# Altium footprint library 13-IC Packages-1bga1.PcbLib: 72 footprints (part 3 of 6) (continued)
## BGA165C100P11X15_1300X1500X140 [mm] "BGA, 1.00mm pitch,rect.;165 pin, 11 columns X 15 rows, 13.00mm X 15.00mm X 1.40mm H"
height 1.4
pads (165):
  round 0.45 smd: A1(-5,7) A2(-4,7) A3(-3,7) A4(-2,7) A5(-1,7) A6(0,7) A7(1,7) A8(2,7) A9(3,7) A10(4,7) A11(5,7) B1(-5,6) B2(-4,6) B3(-3,6) B4(-2,6) B5(-1,6) B6(0,6) B7(1,6) B8(2,6) B9(3,6) B10(4,6) B11(5,6) C1(-5,5) C2(-4,5) C3(-3,5) C4(-2,5) C5(-1,5) C6(0,5) C7(1,5) C8(2,5) C9(3,5) C10(4,5) C11(5,5) D1(-5,4) D2(-4,4) D3(-3,4) D4(-2,4) D5(-1,4) D6(0,4) D7(1,4) D8(2,4) D9(3,4) D10(4,4) D11(5,4) E1(-5,3) E2(-4,3) E3(-3,3) E4(-2,3) E5(-1,3) E6(0,3) E7(1,3) E8(2,3) E9(3,3) E10(4,3) E11(5,3) F1(-5,2) F2(-4,2) F3(-3,2) F4(-2,2) F5(-1,2) F6(0,2) F7(1,2) F8(2,2) F9(3,2) F10(4,2) F11(5,2) G1(-5,1) G2(-4,1) G3(-3,1) G4(-2,1) G5(-1,1) G6(0,1) G7(1,1) G8(2,1) G9(3,1) G10(4,1) G11(5,1) H1(-5,0) H2(-4,0) H3(-3,0) H4(-2,0) H5(-1,0) H6(0,0) H7(1,0) H8(2,0) H9(3,0) H10(4,0) H11(5,0) J1(-5,-1) J2(-4,-1) J3(-3,-1) J4(-2,-1) J5(-1,-1) J6(0,-1) J7(1,-1) J8(2,-1) J9(3,-1) J10(4,-1) J11(5,-1) K1(-5,-2) K2(-4,-2) K3(-3,-2) K4(-2,-2) K5(-1,-2) K6(0,-2) K7(1,-2) K8(2,-2) K9(3,-2) K10(4,-2) K11(5,-2) L1(-5,-3) L2(-4,-3) L3(-3,-3) L4(-2,-3) L5(-1,-3) L6(0,-3) L7(1,-3) L8(2,-3) L9(3,-3) L10(4,-3) L11(5,-3) M1(-5,-4) M2(-4,-4) M3(-3,-4) M4(-2,-4) M5(-1,-4) M6(0,-4) M7(1,-4) M8(2,-4) M9(3,-4) M10(4,-4) M11(5,-4) N1(-5,-5) N2(-4,-5) N3(-3,-5) N4(-2,-5) N5(-1,-5) N6(0,-5) N7(1,-5) N8(2,-5) N9(3,-5) N10(4,-5) N11(5,-5) P1(-5,-6) P2(-4,-6) P3(-3,-6) P4(-2,-6) P5(-1,-6) P6(0,-6) P7(1,-6) P8(2,-6) P9(3,-6) P10(4,-6) P11(5,-6) R1(-5,-7) R2(-4,-7) R3(-3,-7) R4(-2,-7) R5(-1,-7) R6(0,-7) R7(1,-7) R8(2,-7) R9(3,-7) R10(4,-7) R11(5,-7)
Top Overlay:
  circle w0.25: c-7.1,7.75 r0.125
  lines w0.2: -6.5,6.6 -5.5,7.6 ; -6.5,6.8 -5.7,7.6 ; -6.5,7 -5.9,7.6 ; -6.5,7.2 -6.1,7.6 ; -6.5,7.4 -6.3,7.6 ; -6.5,-7.6 -6.5,7.6 6.5,7.6 6.5,-7.6 -6.5,-7.6
Mechanical 14:
  lines w0.1: -6.5,6.5 -5.5,7.5 ; -6.5,6.6 -5.6,7.5 ; -6.5,6.7 -5.7,7.5 ; -6.5,6.8 -5.8,7.5 ; -6.5,6.9 -5.9,7.5 ; -6.5,7 -6,7.5 ; -6.5,7.1 -6.1,7.5 ; -6.5,7.2 -6.2,7.5 ; -6.5,7.3 -6.3,7.5 ; -6.5,7.4 -6.4,7.5 ; -6.5,-7.5 -6.5,7.5 6.5,7.5 6.5,-7.5 -6.5,-7.5
  text "A" at -7.3,6.7 h0.6
  text "B" at -7.3,5.7 h0.6
  text "C" at -7.3,4.7 h0.6
  text "D" at -7.3,3.7 h0.6
  text "E" at -7.3,2.7 h0.6
  text "F" at -7.3,1.7 h0.6
  text "G" at -7.3,0.7 h0.6
  text "H" at -7.3,-0.3 h0.6
  text "J" at -7.3,-1.3 h0.6
  text "K" at -7.3,-2.3 h0.6
  text "L" at -7.3,-3.3 h0.6
  text "M" at -7.3,-4.3 h0.6
  text "N" at -7.3,-5.3 h0.6
  text "P" at -7.3,-6.3 h0.6
  text "R" at -7.3,-7.3 h0.6
  text "1" at -4.675,7.9 h0.6
  text "6" at 0.275,7.9 h0.6
  text "7" at 1.275,7.9 h0.6
  text "8" at 2.25,7.9 h0.6
  text "9" at 3.325,7.9 h0.6
  text "10" at 4.125,7.9 h0.6
  text "11" at 5.175,7.9 h0.6
  text "5" at -0.725,7.9 h0.6
  text "4" at -1.725,7.9 h0.6
  text "3" at -2.725,7.9 h0.6
  text "2" at -3.725,7.9 h0.6
Mechanical 15:
  circle w0.05: c0,0 r0.35
  lines w0.05: -0.5,0 0.5,0 ; 0,-0.5 0,0.5 ; -7.5,-8.5 -7.5,8.5 7.5,8.5 7.5,-8.5 -7.5,-8.5
3D body "BGA165C100P11X15_1300X1500X140.stp": height 1.4, standoff 0, extent -6.5,-7.5 6.5,7.5

## BGA165C100P11X15_1500X1700X140 [mm] "BGA 1mm, Pitch, Rectangular 165 Pin, 11 Columns x 15 Rows, Body 15mm X 17mm X 1.4mm H"
height 1.55
pads (165):
  round 0.45 smd: A1(-5,7) A2(-4,7) A3(-3,7) A4(-2,7) A5(-1,7) A6(0,7) A7(1,7) A8(2,7) A9(3,7) A10(4,7) A11(5,7) B1(-5,6) B2(-4,6) B3(-3,6) B4(-2,6) B5(-1,6) B6(0,6) B7(1,6) B8(2,6) B9(3,6) B10(4,6) B11(5,6) C1(-5,5) C2(-4,5) C3(-3,5) C4(-2,5) C5(-1,5) C6(0,5) C7(1,5) C8(2,5) C9(3,5) C10(4,5) C11(5,5) D1(-5,4) D2(-4,4) D3(-3,4) D4(-2,4) D5(-1,4) D6(0,4) D7(1,4) D8(2,4) D9(3,4) D10(4,4) D11(5,4) E1(-5,3) E2(-4,3) E3(-3,3) E4(-2,3) E5(-1,3) E6(0,3) E7(1,3) E8(2,3) E9(3,3) E10(4,3) E11(5,3) F1(-5,2) F2(-4,2) F3(-3,2) F4(-2,2) F5(-1,2) F6(0,2) F7(1,2) F8(2,2) F9(3,2) F10(4,2) F11(5,2) G1(-5,1) G2(-4,1) G3(-3,1) G4(-2,1) G5(-1,1) G6(0,1) G7(1,1) G8(2,1) G9(3,1) G10(4,1) G11(5,1) H1(-5,0) H2(-4,0) H3(-3,0) H4(-2,0) H5(-1,0) H6(0,0) H7(1,0) H8(2,0) H9(3,0) H10(4,0) H11(5,0) J1(-5,-1) J2(-4,-1) J3(-3,-1) J4(-2,-1) J5(-1,-1) J6(0,-1) J7(1,-1) J8(2,-1) J9(3,-1) J10(4,-1) J11(5,-1) K1(-5,-2) K2(-4,-2) K3(-3,-2) K4(-2,-2) K5(-1,-2) K6(0,-2) K7(1,-2) K8(2,-2) K9(3,-2) K10(4,-2) K11(5,-2) L1(-5,-3) L2(-4,-3) L3(-3,-3) L4(-2,-3) L5(-1,-3) L6(0,-3) L7(1,-3) L8(2,-3) L9(3,-3) L10(4,-3) L11(5,-3) M1(-5,-4) M2(-4,-4) M3(-3,-4) M4(-2,-4) M5(-1,-4) M6(0,-4) M7(1,-4) M8(2,-4) M9(3,-4) M10(4,-4) M11(5,-4) N1(-5,-5) N2(-4,-5) N3(-3,-5) N4(-2,-5) N5(-1,-5) N6(0,-5) N7(1,-5) N8(2,-5) N9(3,-5) N10(4,-5) N11(5,-5) P1(-5,-6) P2(-4,-6) P3(-3,-6) P4(-2,-6) P5(-1,-6) P6(0,-6) P7(1,-6) P8(2,-6) P9(3,-6) P10(4,-6) P11(5,-6) R1(-5,-7) R2(-4,-7) R3(-3,-7) R4(-2,-7) R5(-1,-7) R6(0,-7) R7(1,-7) R8(2,-7) R9(3,-7) R10(4,-7) R11(5,-7)
Top Overlay:
  circle w0.25: c-8.125,7.9 r0.125
  lines w0.2: -7.5,7.5 -6.5,8.5 ; -7.5,7.7 -6.7,8.5 ; -7.5,7.9 -6.9,8.5 ; -7.5,8.1 -7.1,8.5 ; -7.5,8.3 -7.3,8.5 ; -7.5,-8.5 7.5,-8.5 7.5,8.5 -7.5,8.5 -7.5,-8.5
Mechanical 14:
  lines w0.1: -7.5,7.6 -6.6,8.5 ; -7.5,7.7 -6.7,8.5 ; -7.5,7.8 -6.8,8.5 ; -7.5,7.9 -6.9,8.5 ; -7.5,8 -7,8.5 ; -7.5,8.1 -7.1,8.5 ; -7.5,8.2 -7.2,8.5 ; -7.5,8.3 -7.3,8.5 ; -7.5,8.4 -7.4,8.5 ; -7.5,-8.5 -7.5,8.5 7.5,8.5 7.5,-8.5 -7.5,-8.5
  text "1" at -4.675,8.9 h0.6
  text "6" at 0.275,8.9 h0.6
  text "7" at 1.275,8.9 h0.6
  text "8" at 2.25,8.9 h0.6
  text "9" at 3.325,8.9 h0.6
  text "10" at 4.125,8.9 h0.6
  text "11" at 5.175,8.9 h0.6
  text "5" at -0.725,8.9 h0.6
  text "4" at -1.725,8.9 h0.6
  text "3" at -2.725,8.9 h0.6
  text "2" at -3.725,8.9 h0.6
  text "A" at -8.3,6.7 h0.6
  text "B" at -8.3,5.7 h0.6
  text "C" at -8.3,4.7 h0.6
  text "D" at -8.3,3.7 h0.6
  text "E" at -8.3,2.7 h0.6
  text "F" at -8.3,1.7 h0.6
  text "G" at -8.3,0.7 h0.6
  text "H" at -8.3,-0.3 h0.6
  text "J" at -8.3,-1.3 h0.6
  text "K" at -8.3,-2.3 h0.6
  text "L" at -8.3,-3.3 h0.6
  text "M" at -8.3,-4.3 h0.6
  text "N" at -8.3,-5.3 h0.6
  text "P" at -8.3,-6.3 h0.6
  text "R" at -8.3,-7.3 h0.6
Mechanical 15:
  lines w0.05: -0.5,0 0.5,0 ; 0,-0.5 0,0.5 ; -8.5,-9.5 -8.5,9.5 8.5,9.5 8.5,-9.5 -8.5,-9.5
3D body "BGA165C100P11X15_1500X1700X140.stp": height 1.4, standoff 0, extent -7.5,-8.5 7.5,8.5

## BGA176C80P15X15_1300X1300X140 [mm] "BGA, 0.80mm Pitch, Square; 176 Pin, 15 Columns X 15 Rows,13.00mm X 13.00mm X 1.40mm H"
height 1.4
pads (176):
  round 0.45 smd: A1(-5.6,5.6) A2(-4.8,5.6) A3(-4,5.6) A4(-3.2,5.6) A5(-2.4,5.6) A6(-1.6,5.6) A7(-0.8,5.6) A8(0,5.6) A9(0.8,5.6) A10(1.6,5.6) A11(2.4,5.6) A12(3.2,5.6) A13(4,5.6) A14(4.8,5.6) A15(5.6,5.6) B1(-5.6,4.8) B2(-4.8,4.8) B3(-4,4.8) B4(-3.2,4.8) B5(-2.4,4.8) B6(-1.6,4.8) B7(-0.8,4.8) B8(0,4.8) B9(0.8,4.8) B10(1.6,4.8) B11(2.4,4.8) B12(3.2,4.8) B13(4,4.8) B14(4.8,4.8) B15(5.6,4.8) C1(-5.6,4) C2(-4.8,4) C3(-4,4) C4(-3.2,4) C5(-2.4,4) C6(-1.6,4) C7(-0.8,4) C8(0,4) C9(0.8,4) C10(1.6,4) C11(2.4,4) C12(3.2,4) C13(4,4) C14(4.8,4) C15(5.6,4) D1(-5.6,3.2) D2(-4.8,3.2) D3(-4,3.2) D4(-3.2,3.2) D5(-2.4,3.2) D6(-1.6,3.2) D7(-0.8,3.2) D8(0,3.2) D9(0.8,3.2) D10(1.6,3.2) D11(2.4,3.2) D12(3.2,3.2) D13(4,3.2) D14(4.8,3.2) D15(5.6,3.2) E1(-5.6,2.4) E2(-4.8,2.4) E3(-4,2.4) E4(-3.2,2.4) E12(3.2,2.4) E13(4,2.4) E14(4.8,2.4) E15(5.6,2.4) F1(-5.6,1.6) F2(-4.8,1.6) F3(-4,1.6) F4(-3.2,1.6) F12(3.2,1.6) F13(4,1.6) F14(4.8,1.6) F15(5.6,1.6) G1(-5.6,0.8) G2(-4.8,0.8) G3(-4,0.8) G4(-3.2,0.8) G12(3.2,0.8) G13(4,0.8) G14(4.8,0.8) G15(5.6,0.8) H1(-5.6,0) H2(-4.8,0) H3(-4,0) H4(-3.2,0) H12(3.2,0) H13(4,0) H14(4.8,0) H15(5.6,0) J1(-5.6,-0.8) J2(-4.8,-0.8) J3(-4,-0.8) J4(-3.2,-0.8) J12(3.2,-0.8) J13(4,-0.8) J14(4.8,-0.8) J15(5.6,-0.8) K1(-5.6,-1.6) K2(-4.8,-1.6) K3(-4,-1.6) K4(-3.2,-1.6) K12(3.2,-1.6) K13(4,-1.6) K14(4.8,-1.6) K15(5.6,-1.6) L1(-5.6,-2.4) L2(-4.8,-2.4) L3(-4,-2.4) L4(-3.2,-2.4) L12(3.2,-2.4) L13(4,-2.4) L14(4.8,-2.4) L15(5.6,-2.4) M1(-5.6,-3.2) M2(-4.8,-3.2) M3(-4,-3.2) M4(-3.2,-3.2) M5(-2.4,-3.2) M6(-1.6,-3.2) M7(-0.8,-3.2) M8(0,-3.2) M9(0.8,-3.2) M10(1.6,-3.2) M11(2.4,-3.2) M12(3.2,-3.2) M13(4,-3.2) M14(4.8,-3.2) M15(5.6,-3.2) N1(-5.6,-4) N2(-4.8,-4) N3(-4,-4) N4(-3.2,-4) N5(-2.4,-4) N6(-1.6,-4) N7(-0.8,-4) N8(0,-4) N9(0.8,-4) N10(1.6,-4) N11(2.4,-4) N12(3.2,-4) N13(4,-4) N14(4.8,-4) N15(5.6,-4) P1(-5.6,-4.8) P2(-4.8,-4.8) P3(-4,-4.8) P4(-3.2,-4.8) P5(-2.4,-4.8) P6(-1.6,-4.8) P7(-0.8,-4.8) P8(0,-4.8) P9(0.8,-4.8) P10(1.6,-4.8) P11(2.4,-4.8) P12(3.2,-4.8) P13(4,-4.8) P14(4.8,-4.8) P15(5.6,-4.8) R1(-5.6,-5.6) R2(-4.8,-5.6) R3(-4,-5.6) R4(-3.2,-5.6) R5(-2.4,-5.6) R6(-1.6,-5.6) R7(-0.8,-5.6) R8(0,-5.6) R9(0.8,-5.6) R10(1.6,-5.6) R11(2.4,-5.6) R12(3.2,-5.6) R13(4,-5.6) R14(4.8,-5.6) R15(5.6,-5.6)
Top Overlay:
  circle w0.25: c-7.1,5.6 r0.125
  lines w0.2: -6.5,5.5 -5.5,6.5 ; -6.5,5.7 -5.7,6.5 ; -6.5,5.9 -5.9,6.5 ; -6.5,6.1 -6.1,6.5 ; -6.5,6.3 -6.3,6.5 ; -6.5,-6.5 -6.5,6.5 6.5,6.5 6.5,-6.5 -6.5,-6.5
Mechanical 14:
  lines w0.1: -6.5,5.5 -5.5,6.5 ; -6.5,5.6 -5.6,6.5 ; -6.5,5.7 -5.7,6.5 ; -6.5,5.8 -5.8,6.5 ; -6.5,5.9 -5.9,6.5 ; -6.5,6 -6,6.5 ; -6.5,6.1 -6.1,6.5 ; -6.5,6.2 -6.2,6.5 ; -6.5,6.3 -6.3,6.5 ; -6.5,6.4 -6.4,6.5 ; -6.5,-6.5 -6.5,6.5 6.5,6.5 6.5,-6.5 -6.5,-6.5
  text "P" at -7.2,-5.05 h0.6
  text "N" at -7.2,-4.25 h0.6
  text "M" at -7.2,-3.45 h0.6
  text "L" at -7.2,-2.65 h0.6
  text "R" at -7.2,-5.85 h0.6
  text "J" at -7.2,-1.05 h0.6
  text "A" at -7.2,5.35 h0.6
  text "B" at -7.2,4.55 h0.6
  text "C" at -7.2,3.75 h0.6
  text "D" at -7.2,2.95 h0.6
  text "E" at -7.2,2.15 h0.6
  text "F" at -7.2,1.35 h0.6
  text "G" at -7.2,0.55 h0.6
  text "H" at -7.2,-0.25 h0.6
  text "K" at -7.2,-1.85 h0.6
  text "9" at 0.625,6.8 h0.6
  text "8" at -0.175,6.8 h0.6
  text "7" at -0.975,6.8 h0.6
  text "6" at -1.775,6.8 h0.6
  text "5" at -2.575,6.8 h0.6
  text "4" at -3.375,6.8 h0.6
  text "3" at -4.175,6.8 h0.6
  text "1" at -5.775,6.8 h0.6
  text "2" at -5.075,6.8 h0.6
  text "15" at 5.5,6.8 h0.6
  text "-" at 4.625,6.8 h0.6
  text "-" at 3.025,6.8 h0.6
  text "-" at 1.425,6.8 h0.6
  text "-" at 2.225,6.8 h0.6
  text "-" at 3.825,6.8 h0.6
Mechanical 15:
  circle w0.05: c0,0 r0.35
  lines w0.05: -0.5,0 0.5,0 ; 0,-0.5 0,0.5 ; -7.5,-7.5 -7.5,7.5 7.5,7.5 7.5,-7.5 -7.5,-7.5
3D body "BGA176C80P15X15_1300X1300X140.stp": height 1.4, standoff 0, extent -6.5,-6.5 6.5,6.5

## BGA176C100P14X14_1500X1500X205 [mm] "BGA, 1.00mm Pitch, Square; 176 Pin, 14 Columns X 14 Rows, 15.00mm X 15.00mm X 2.05mm H"
height 2.05
pads (178):
  round 0.5 smd: A1(-6.5,6.5) A2(-5.5,6.5) A3(-4.5,6.5) A4(-3.5,6.5) A5(-2.5,6.5) A6(-1.5,6.5) A7(-0.5,6.5) A8(0.5,6.5) A9(1.5,6.5) A10(2.5,6.5) A11(3.5,6.5) A12(4.5,6.5) A13(5.5,6.5) A14(6.5,6.5) B1(-6.5,5.5) B2(-5.5,5.5) B3(-4.5,5.5) B4(-3.5,5.5) B5(-2.5,5.5) B6(-1.5,5.5) B7(-0.5,5.5) B8(0.5,5.5) B9(1.5,5.5) B10(2.5,5.5) B11(3.5,5.5) B12(4.5,5.5) B13(5.5,5.5) B14(6.5,5.5) C1(-6.5,4.5) C2(-5.5,4.5) C3(-4.5,4.5) C4(-3.5,4.5) C5(-2.5,4.5) C6(-1.5,4.5) C7(-0.5,4.5) C8(0.5,4.5) C9(1.5,4.5) C10(2.5,4.5) C11(3.5,4.5) C12(4.5,4.5) C13(5.5,4.5) C14(6.5,4.5) D1(-6.5,3.5) D2(-5.5,3.5) D3(-4.5,3.5) D4(-3.5,3.5) D5(-2.5,3.5) D6(-1.5,3.5) D7(-0.5,3.5) D8(0.5,3.5) D9(1.5,3.5) D10(2.5,3.5) D11(3.5,3.5) D12(4.5,3.5) D13(5.5,3.5) D14(6.5,3.5) E1(-6.5,2.5) E2(-5.5,2.5) E3(-4.5,2.5) E4(-3.5,2.5) E11(3.5,2.5) E12(4.5,2.5) E13(5.5,2.5) E14(6.5,2.5) F1(-6.5,1.5) F2(-5.5,1.5) F3(-4.5,1.5) F4(-3.5,1.5) F6(-1.5,1.5) F7(-0.5,1.5) F8(0.5,1.5) F9(1.5,1.5) F11(3.5,1.5) F12(4.5,1.5) F13(5.5,1.5) F14(6.5,1.5) G1(-6.5,0.5) G2(-5.5,0.5) G3(-4.5,0.5) G4(-3.5,0.5) G6(-1.5,0.5) G7(-0.5,0.5) G8(0.5,0.5) G9(1.5,0.5) G11(3.5,0.5) G12(4.5,0.5) G13(5.5,0.5) G14(6.5,0.5) H1(-6.5,-0.5) H2(-5.5,-0.5) H3(-4.5,-0.5) H4(-3.5,-0.5) H6(-1.5,-0.5) H7(-0.5,-0.5) H8(0.5,-0.5) H9(1.5,-0.5) H11(3.5,-0.5) H12(4.5,-0.5) H13(5.5,-0.5) H14(6.5,-0.5) J1(-6.5,-1.5) J2(-5.5,-1.5) J3(-4.5,-1.5) J4(-3.5,-1.5) J6(-1.5,-1.5) J7(-0.5,-1.5) J8(0.5,-1.5) J9(1.5,-1.5) J11(3.5,-1.5) J12(4.5,-1.5) J13(5.5,-1.5) J14(6.5,-1.5) K1(-6.5,-2.5) K2(-5.5,-2.5) K3(-4.5,-2.5) K4(-3.5,-2.5) K11(3.5,-2.5) K12(4.5,-2.5) K13(5.5,-2.5) K14(6.5,-2.5) L1(-6.5,-3.5) L2(-5.5,-3.5) L3(-4.5,-3.5) L4(-3.5,-3.5) L5(-2.5,-3.5) L6(-1.5,-3.5) L7(-0.5,-3.5) L8(0.5,-3.5) L9(1.5,-3.5) L10(2.5,-3.5) L11(3.5,-3.5) L12(4.5,-3.5) L13(5.5,-3.5) L14(6.5,-3.5) M1(-6.5,-4.5) M2(-5.5,-4.5) M3(-4.5,-4.5) M4(-3.5,-4.5) M5(-2.5,-4.5) M6(-1.5,-4.5) M7(-0.5,-4.5) M8(0.5,-4.5) M9(1.5,-4.5) M10(2.5,-4.5) M11(3.5,-4.5) M12(4.5,-4.5) M13(5.5,-4.5) M14(6.5,-4.5) N1(-6.5,-5.5) N2(-5.5,-5.5) N3(-4.5,-5.5) N4(-3.5,-5.5) N5(-2.5,-5.5) N6(-1.5,-5.5) N7(-0.5,-5.5) N8(0.5,-5.5) N9(1.5,-5.5) N10(2.5,-5.5) N11(3.5,-5.5) N12(4.5,-5.5) N13(5.5,-5.5) N14(6.5,-5.5) P1(-6.5,-6.5) P2(-5.5,-6.5) P3(-4.5,-6.5) P4(-3.5,-6.5) P5(-2.5,-6.5) P6(-1.5,-6.5) P7(-0.5,-6.5) P8(0.5,-6.5) P9(1.5,-6.5) P10(2.5,-6.5) P11(3.5,-6.5) P12(4.5,-6.5) P13(5.5,-6.5) P14(6.5,-6.5)
  round 1 smd paste-0.51 mask+0.5: FTG1(-8.35,-8.35) FTG2(8.35,8.35)
Top Layer keep-out:
  circle w0.1: c8.35,8.35 r1
  circle w0.1: c-8.35,-8.35 r1
Top Overlay:
  circle w0.25: c-8.1,6.5 r0.125
  lines w0.2: -7.5,6.5 -6.5,7.5 ; -7.5,6.7 -6.7,7.5 ; -7.5,6.9 -6.9,7.5 ; -7.5,7.1 -7.1,7.5 ; -7.5,7.3 -7.3,7.5 ; -7.5,-7.5 -7.5,7.5 7.5,7.5 7.5,-7.5 -7.5,-7.5
Mechanical 14:
  lines w0.1: -7.5,6.5 -6.5,7.5 ; -7.5,6.6 -6.6,7.5 ; -7.5,6.7 -6.7,7.5 ; -7.5,6.8 -6.8,7.5 ; -7.5,6.9 -6.9,7.5 ; -7.5,7 -7,7.5 ; -7.5,7.1 -7.1,7.5 ; -7.5,7.2 -7.2,7.5 ; -7.5,7.3 -7.3,7.5 ; -7.5,7.4 -7.4,7.5 ; -7.5,-7.5 -7.5,7.5 7.5,7.5 7.5,-7.5 -7.5,-7.5
  text "P" at -8.4,-6.8 h0.6
  text "N" at -8.4,-5.8 h0.6
  text "M" at -8.4,-4.8 h0.6
  text "L" at -8.4,-3.8 h0.6
  text "K" at -8.4,-2.8 h0.6
  text "J" at -8.4,-1.8 h0.6
  text "H" at -8.4,-0.8 h0.6
  text "G" at -8.4,0.2 h0.6
  text "F" at -8.4,1.2 h0.6
  text "E" at -8.4,2.2 h0.6
  text "D" at -8.4,3.2 h0.6
  text "C" at -8.4,4.2 h0.6
  text "B" at -8.4,5.2 h0.6
  text "A" at -8.4,6.2 h0.6
  text "2" at -5.125,8 h0.6
  text "3" at -4.125,8 h0.6
  text "4" at -3.125,8 h0.6
  text "5" at -2.125,8 h0.6
  text "14" at 6.65,8 h0.6
  text "13" at 5.675,8 h0.6
  text "12" at 4.7,8 h0.6
  text "11" at 3.775,8 h0.6
  text "10" at 2.725,8 h0.6
  text "9" at 1.925,8 h0.6
  text "8" at 0.85,8 h0.6
  text "7" at -0.125,8 h0.6
  text "6" at -1.125,8 h0.6
  text "1" at -6.075,8 h0.6
Mechanical 15:
  circle w0.05: c0,0 r0.35
  lines w0.05: -0.5,0 0.5,0 ; 0,-0.5 0,0.5 ; -9.5,-9.5 -9.5,9.5 9.5,9.5 9.5,-9.5 -9.5,-9.5
3D body "BGA176C100P14X14_1500X1500X205.stp": height 2.05, standoff 0, extent -7.6,-7.6 7.6,7.6

## BGA196C50P14X14_800X800X110 [mm] "BGA, 0.50mm Pitch, Square; 196 Pin, 14 Columns X 14 Rows, 8.00mm X 8.00mm X 1.20mm H"
height 1.2
pads (198):
  round 0.25 smd: A1(-3.25,3.25) A2(-2.75,3.25) A3(-2.25,3.25) A4(-1.75,3.25) A5(-1.25,3.25) A6(-0.75,3.25) A7(-0.25,3.25) A8(0.25,3.25) A9(0.75,3.25) A10(1.25,3.25) A11(1.75,3.25) A12(2.25,3.25) A13(2.75,3.25) A14(3.25,3.25) B1(-3.25,2.75) B2(-2.75,2.75) B3(-2.25,2.75) B4(-1.75,2.75) B5(-1.25,2.75) B6(-0.75,2.75) B7(-0.25,2.75) B8(0.25,2.75) B9(0.75,2.75) B10(1.25,2.75) B11(1.75,2.75) B12(2.25,2.75) B13(2.75,2.75) B14(3.25,2.75) C1(-3.25,2.25) C2(-2.75,2.25) C3(-2.25,2.25) C4(-1.75,2.25) C5(-1.25,2.25) C6(-0.75,2.25) C7(-0.25,2.25) C8(0.25,2.25) C9(0.75,2.25) C10(1.25,2.25) C11(1.75,2.25) C12(2.25,2.25) C13(2.75,2.25) C14(3.25,2.25) D1(-3.25,1.75) D2(-2.75,1.75) D3(-2.25,1.75) D4(-1.75,1.75) D5(-1.25,1.75) D6(-0.75,1.75) D7(-0.25,1.75) D8(0.25,1.75) D9(0.75,1.75) D10(1.25,1.75) D11(1.75,1.75) D12(2.25,1.75) D13(2.75,1.75) D14(3.25,1.75) E1(-3.25,1.25) E2(-2.75,1.25) E3(-2.25,1.25) E4(-1.75,1.25) E5(-1.25,1.25) E6(-0.75,1.25) E7(-0.25,1.25) E8(0.25,1.25) E9(0.75,1.25) E10(1.25,1.25) E11(1.75,1.25) E12(2.25,1.25) E13(2.75,1.25) E14(3.25,1.25) F1(-3.25,0.75) F2(-2.75,0.75) F3(-2.25,0.75) F4(-1.75,0.75) F5(-1.25,0.75) F6(-0.75,0.75) F7(-0.25,0.75) F8(0.25,0.75) F9(0.75,0.75) F10(1.25,0.75) F11(1.75,0.75) F12(2.25,0.75) F13(2.75,0.75) F14(3.25,0.75) G1(-3.25,0.25) G2(-2.75,0.25) G3(-2.25,0.25) G4(-1.75,0.25) G5(-1.25,0.25) G6(-0.75,0.25) G7(-0.25,0.25) G8(0.25,0.25) G9(0.75,0.25) G10(1.25,0.25) G11(1.75,0.25) G12(2.25,0.25) G13(2.75,0.25) G14(3.25,0.25) H1(-3.25,-0.25) H2(-2.75,-0.25) H3(-2.25,-0.25) H4(-1.75,-0.25) H5(-1.25,-0.25) H6(-0.75,-0.25) H7(-0.25,-0.25) H8(0.25,-0.25) H9(0.75,-0.25) H10(1.25,-0.25) H11(1.75,-0.25) H12(2.25,-0.25) H13(2.75,-0.25) H14(3.25,-0.25) J1(-3.25,-0.75) J2(-2.75,-0.75) J3(-2.25,-0.75) J4(-1.75,-0.75) J5(-1.25,-0.75) J6(-0.75,-0.75) J7(-0.25,-0.75) J8(0.25,-0.75) J9(0.75,-0.75) J10(1.25,-0.75) J11(1.75,-0.75) J12(2.25,-0.75) J13(2.75,-0.75) J14(3.25,-0.75) K1(-3.25,-1.25) K2(-2.75,-1.25) K3(-2.25,-1.25) K4(-1.75,-1.25) K5(-1.25,-1.25) K6(-0.75,-1.25) K7(-0.25,-1.25) K8(0.25,-1.25) K9(0.75,-1.25) K10(1.25,-1.25) K11(1.75,-1.25) K12(2.25,-1.25) K13(2.75,-1.25) K14(3.25,-1.25) L1(-3.25,-1.75) L2(-2.75,-1.75) L3(-2.25,-1.75) L4(-1.75,-1.75) L5(-1.25,-1.75) L6(-0.75,-1.75) L7(-0.25,-1.75) L8(0.25,-1.75) L9(0.75,-1.75) L10(1.25,-1.75) L11(1.75,-1.75) L12(2.25,-1.75) L13(2.75,-1.75) L14(3.25,-1.75) M1(-3.25,-2.25) M2(-2.75,-2.25) M3(-2.25,-2.25) M4(-1.75,-2.25) M5(-1.25,-2.25) M6(-0.75,-2.25) M7(-0.25,-2.25) M8(0.25,-2.25) M9(0.75,-2.25) M10(1.25,-2.25) M11(1.75,-2.25) M12(2.25,-2.25) M13(2.75,-2.25) M14(3.25,-2.25) N1(-3.25,-2.75) N2(-2.75,-2.75) N3(-2.25,-2.75) N4(-1.75,-2.75) N5(-1.25,-2.75) N6(-0.75,-2.75) N7(-0.25,-2.75) N8(0.25,-2.75) N9(0.75,-2.75) N10(1.25,-2.75) N11(1.75,-2.75) N12(2.25,-2.75) N13(2.75,-2.75) N14(3.25,-2.75) P1(-3.25,-3.25) P2(-2.75,-3.25) P3(-2.25,-3.25) P4(-1.75,-3.25) P5(-1.25,-3.25) P6(-0.75,-3.25) P7(-0.25,-3.25) P8(0.25,-3.25) P9(0.75,-3.25) P10(1.25,-3.25) P11(1.75,-3.25) P12(2.25,-3.25) P13(2.75,-3.25) P14(3.25,-3.25)
  round 1 smd paste-0.51 mask+0.5: FTG1(-4.85,-4.85) FTG2(4.85,4.85)
Top Layer keep-out:
  circle w0.1: c4.85,4.85 r1
  circle w0.1: c-4.85,-4.85 r1
Top Overlay:
  circle w0.25: c-4.6,3.25 r0.125
  lines w0.2: -4,-4 -4,4 4,4 4,-4 -4,-4
Mechanical 14:
  lines w0.1: -4,3 -3,4 ; -4,3.1 -3.1,4 ; -4,3.2 -3.2,4 ; -4,3.3 -3.3,4 ; -4,3.4 -3.4,4 ; -4,3.5 -3.5,4 ; -4,3.6 -3.6,4 ; -4,3.7 -3.7,4 ; -4,3.8 -3.8,4 ; -4,3.9 -3.9,4 ; -4,-4 -4,4 4,4 4,-4 -4,-4
  text "14" at 3.429,4.491 h0.6
  text "A" at -4.942,2.95 h0.6
  text "P" at -4.942,-3.55 h0.6
  text "1" at -2.796,4.491 h0.6
Mechanical 15:
  circle w0.05: c0,0 r0.35
  lines w0.05: -0.5,0 0.5,0 ; 0,-0.5 0,0.5 ; -5,-5 -5,5 5,5 5,-5 -5,-5
Mechanical 16:
  lines w0.001: -4,-4 -4,4 4,4 4,-4 -4,-4
3D body "BGA196C50P14X14_800X800X110.stp": height 1.2, standoff 0, extent -4,-4 4,4

## BGA196C100P14X14_1500X1500X147 [mm] "BGA,1.00mm pitch,square;196 pin,14 columns X 14 rows,15.00mm X 15.00mm X 1.47mm H"
height 1.47
pads (198):
  round 0.45 smd: A1(-6.5,6.5) A2(-5.5,6.5) A3(-4.5,6.5) A4(-3.5,6.5) A5(-2.5,6.5) A6(-1.5,6.5) A7(-0.5,6.5) A8(0.5,6.5) A9(1.5,6.5) A10(2.5,6.5) A11(3.5,6.5) A12(4.5,6.5) A13(5.5,6.5) A14(6.5,6.5) B1(-6.5,5.5) B2(-5.5,5.5) B3(-4.5,5.5) B4(-3.5,5.5) B5(-2.5,5.5) B6(-1.5,5.5) B7(-0.5,5.5) B8(0.5,5.5) B9(1.5,5.5) B10(2.5,5.5) B11(3.5,5.5) B12(4.5,5.5) B13(5.5,5.5) B14(6.5,5.5) C1(-6.5,4.5) C2(-5.5,4.5) C3(-4.5,4.5) C4(-3.5,4.5) C5(-2.5,4.5) C6(-1.5,4.5) C7(-0.5,4.5) C8(0.5,4.5) C9(1.5,4.5) C10(2.5,4.5) C11(3.5,4.5) C12(4.5,4.5) C13(5.5,4.5) C14(6.5,4.5) D1(-6.5,3.5) D2(-5.5,3.5) D3(-4.5,3.5) D4(-3.5,3.5) D5(-2.5,3.5) D6(-1.5,3.5) D7(-0.5,3.5) D8(0.5,3.5) D9(1.5,3.5) D10(2.5,3.5) D11(3.5,3.5) D12(4.5,3.5) D13(5.5,3.5) D14(6.5,3.5) E1(-6.5,2.5) E2(-5.5,2.5) E3(-4.5,2.5) E4(-3.5,2.5) E5(-2.5,2.5) E6(-1.5,2.5) E7(-0.5,2.5) E8(0.5,2.5) E9(1.5,2.5) E10(2.5,2.5) E11(3.5,2.5) E12(4.5,2.5) E13(5.5,2.5) E14(6.5,2.5) F1(-6.5,1.5) F2(-5.5,1.5) F3(-4.5,1.5) F4(-3.5,1.5) F5(-2.5,1.5) F6(-1.5,1.5) F7(-0.5,1.5) F8(0.5,1.5) F9(1.5,1.5) F10(2.5,1.5) F11(3.5,1.5) F12(4.5,1.5) F13(5.5,1.5) F14(6.5,1.5) G1(-6.5,0.5) G2(-5.5,0.5) G3(-4.5,0.5) G4(-3.5,0.5) G5(-2.5,0.5) G6(-1.5,0.5) G7(-0.5,0.5) G8(0.5,0.5) G9(1.5,0.5) G10(2.5,0.5) G11(3.5,0.5) G12(4.5,0.5) G13(5.5,0.5) G14(6.5,0.5) H1(-6.5,-0.5) H2(-5.5,-0.5) H3(-4.5,-0.5) H4(-3.5,-0.5) H5(-2.5,-0.5) H6(-1.5,-0.5) H7(-0.5,-0.5) H8(0.5,-0.5) H9(1.5,-0.5) H10(2.5,-0.5) H11(3.5,-0.5) H12(4.5,-0.5) H13(5.5,-0.5) H14(6.5,-0.5) J1(-6.5,-1.5) J2(-5.5,-1.5) J3(-4.5,-1.5) J4(-3.5,-1.5) J5(-2.5,-1.5) J6(-1.5,-1.5) J7(-0.5,-1.5) J8(0.5,-1.5) J9(1.5,-1.5) J10(2.5,-1.5) J11(3.5,-1.5) J12(4.5,-1.5) J13(5.5,-1.5) J14(6.5,-1.5) K1(-6.5,-2.5) K2(-5.5,-2.5) K3(-4.5,-2.5) K4(-3.5,-2.5) K5(-2.5,-2.5) K6(-1.5,-2.5) K7(-0.5,-2.5) K8(0.5,-2.5) K9(1.5,-2.5) K10(2.5,-2.5) K11(3.5,-2.5) K12(4.5,-2.5) K13(5.5,-2.5) K14(6.5,-2.5) L1(-6.5,-3.5) L2(-5.5,-3.5) L3(-4.5,-3.5) L4(-3.5,-3.5) L5(-2.5,-3.5) L6(-1.5,-3.5) L7(-0.5,-3.5) L8(0.5,-3.5) L9(1.5,-3.5) L10(2.5,-3.5) L11(3.5,-3.5) L12(4.5,-3.5) L13(5.5,-3.5) L14(6.5,-3.5) M1(-6.5,-4.5) M2(-5.5,-4.5) M3(-4.5,-4.5) M4(-3.5,-4.5) M5(-2.5,-4.5) M6(-1.5,-4.5) M7(-0.5,-4.5) M8(0.5,-4.5) M9(1.5,-4.5) M10(2.5,-4.5) M11(3.5,-4.5) M12(4.5,-4.5) M13(5.5,-4.5) M14(6.5,-4.5) N1(-6.5,-5.5) N2(-5.5,-5.5) N3(-4.5,-5.5) N4(-3.5,-5.5) N5(-2.5,-5.5) N6(-1.5,-5.5) N7(-0.5,-5.5) N8(0.5,-5.5) N9(1.5,-5.5) N10(2.5,-5.5) N11(3.5,-5.5) N12(4.5,-5.5) N13(5.5,-5.5) N14(6.5,-5.5) P1(-6.5,-6.5) P2(-5.5,-6.5) P3(-4.5,-6.5) P4(-3.5,-6.5) P5(-2.5,-6.5) P6(-1.5,-6.5) P7(-0.5,-6.5) P8(0.5,-6.5) P9(1.5,-6.5) P10(2.5,-6.5) P11(3.5,-6.5) P12(4.5,-6.5) P13(5.5,-6.5) P14(6.5,-6.5)
  round 1 smd paste-0.51 mask+0.5: FTG1(-8.35,-8.35) FTG2(8.35,8.35)
Top Layer keep-out:
  circle w0.1: c8.35,8.35 r1
  circle w0.1: c-8.35,-8.35 r1
Top Overlay:
  circle w0.25: c-8.1,6.5 r0.125
  lines w0.2: -7.5,6.5 -6.5,7.5 ; -7.5,6.7 -6.7,7.5 ; -7.5,6.9 -6.9,7.5 ; -7.5,7.1 -7.1,7.5 ; -7.5,7.3 -7.3,7.5 ; -7.5,-7.5 7.5,-7.5 7.5,7.5 -7.5,7.5 -7.5,-7.5
Mechanical 14:
  lines w0.1: -7.5,6.5 -6.5,7.5 ; -7.5,6.6 -6.6,7.5 ; -7.5,6.7 -6.7,7.5 ; -7.5,6.8 -6.8,7.5 ; -7.5,6.9 -6.9,7.5 ; -7.5,7 -7,7.5 ; -7.5,7.1 -7.1,7.5 ; -7.5,7.2 -7.2,7.5 ; -7.5,7.3 -7.3,7.5 ; -7.5,7.4 -7.4,7.5 ; -7.5,-7.5 7.5,-7.5 7.5,7.5 -7.5,7.5 -7.5,-7.5
  text "P" at -8.4,-6.8 h0.6
  text "N" at -8.4,-5.8 h0.6
  text "M" at -8.4,-4.8 h0.6
  text "L" at -8.4,-3.8 h0.6
  text "K" at -8.4,-2.8 h0.6
  text "J" at -8.4,-1.8 h0.6
  text "H" at -8.4,-0.8 h0.6
  text "G" at -8.4,0.2 h0.6
  text "F" at -8.4,1.2 h0.6
  text "E" at -8.4,2.2 h0.6
  text "D" at -8.4,3.2 h0.6
  text "C" at -8.4,4.2 h0.6
  text "B" at -8.4,5.2 h0.6
  text "A" at -8.4,6.2 h0.6
  text "2" at -5.125,8 h0.6
  text "3" at -4.125,8 h0.6
  text "4" at -3.125,8 h0.6
  text "5" at -2.125,8 h0.6
  text "14" at 6.65,8 h0.6
  text "13" at 5.675,8 h0.6
  text "12" at 4.7,8 h0.6
  text "11" at 3.775,8 h0.6
  text "10" at 2.725,8 h0.6
  text "9" at 1.925,8 h0.6
  text "8" at 0.85,8 h0.6
  text "7" at -0.125,8 h0.6
  text "6" at -1.125,8 h0.6
  text "1" at -6.075,8 h0.6
Mechanical 15:
  circle w0.05: c0,0 r0.35
  lines w0.05: -0.5,0 0.5,0 ; 0,-0.5 0,0.5 ; -8.5,-8.5 8.5,-8.5 8.5,8.5 -8.5,8.5 -8.5,-8.5
3D body "BGA196C100P14X14_1500X1500X147.stp": height 1.47, standoff 0, extent -7.6,-7.6 7.6,7.6

## BGA196C100P14X14_1500X1500X181 [mm] "BGA, 1.00mm Pitch, Square; 196 Pin, 14 Columns X 14 Rows, 15.00mm X 15.00mm X 1.81mm H"
height 1.81
pads (198):
  round 0.5 smd: A1(-6.5,6.5) A2(-5.5,6.5) A3(-4.5,6.5) A4(-3.5,6.5) A5(-2.5,6.5) A6(-1.5,6.5) A7(-0.5,6.5) A8(0.5,6.5) A9(1.5,6.5) A10(2.5,6.5) A11(3.5,6.5) A12(4.5,6.5) A13(5.5,6.5) A14(6.5,6.5) B1(-6.5,5.5) B2(-5.5,5.5) B3(-4.5,5.5) B4(-3.5,5.5) B5(-2.5,5.5) B6(-1.5,5.5) B7(-0.5,5.5) B8(0.5,5.5) B9(1.5,5.5) B10(2.5,5.5) B11(3.5,5.5) B12(4.5,5.5) B13(5.5,5.5) B14(6.5,5.5) C1(-6.5,4.5) C2(-5.5,4.5) C3(-4.5,4.5) C4(-3.5,4.5) C5(-2.5,4.5) C6(-1.5,4.5) C7(-0.5,4.5) C8(0.5,4.5) C9(1.5,4.5) C10(2.5,4.5) C11(3.5,4.5) C12(4.5,4.5) C13(5.5,4.5) C14(6.5,4.5) D1(-6.5,3.5) D2(-5.5,3.5) D3(-4.5,3.5) D4(-3.5,3.5) D5(-2.5,3.5) D6(-1.5,3.5) D7(-0.5,3.5) D8(0.5,3.5) D9(1.5,3.5) D10(2.5,3.5) D11(3.5,3.5) D12(4.5,3.5) D13(5.5,3.5) D14(6.5,3.5) E1(-6.5,2.5) E2(-5.5,2.5) E3(-4.5,2.5) E4(-3.5,2.5) E5(-2.5,2.5) E6(-1.5,2.5) E7(-0.5,2.5) E8(0.5,2.5) E9(1.5,2.5) E10(2.5,2.5) E11(3.5,2.5) E12(4.5,2.5) E13(5.5,2.5) E14(6.5,2.5) F1(-6.5,1.5) F2(-5.5,1.5) F3(-4.5,1.5) F4(-3.5,1.5) F5(-2.5,1.5) F6(-1.5,1.5) F7(-0.5,1.5) F8(0.5,1.5) F9(1.5,1.5) F10(2.5,1.5) F11(3.5,1.5) F12(4.5,1.5) F13(5.5,1.5) F14(6.5,1.5) G1(-6.5,0.5) G2(-5.5,0.5) G3(-4.5,0.5) G4(-3.5,0.5) G5(-2.5,0.5) G6(-1.5,0.5) G7(-0.5,0.5) G8(0.5,0.5) G9(1.5,0.5) G10(2.5,0.5) G11(3.5,0.5) G12(4.5,0.5) G13(5.5,0.5) G14(6.5,0.5) H1(-6.5,-0.5) H2(-5.5,-0.5) H3(-4.5,-0.5) H4(-3.5,-0.5) H5(-2.5,-0.5) H6(-1.5,-0.5) H7(-0.5,-0.5) H8(0.5,-0.5) H9(1.5,-0.5) H10(2.5,-0.5) H11(3.5,-0.5) H12(4.5,-0.5) H13(5.5,-0.5) H14(6.5,-0.5) J1(-6.5,-1.5) J2(-5.5,-1.5) J3(-4.5,-1.5) J4(-3.5,-1.5) J5(-2.5,-1.5) J6(-1.5,-1.5) J7(-0.5,-1.5) J8(0.5,-1.5) J9(1.5,-1.5) J10(2.5,-1.5) J11(3.5,-1.5) J12(4.5,-1.5) J13(5.5,-1.5) J14(6.5,-1.5) K1(-6.5,-2.5) K2(-5.5,-2.5) K3(-4.5,-2.5) K4(-3.5,-2.5) K5(-2.5,-2.5) K6(-1.5,-2.5) K7(-0.5,-2.5) K8(0.5,-2.5) K9(1.5,-2.5) K10(2.5,-2.5) K11(3.5,-2.5) K12(4.5,-2.5) K13(5.5,-2.5) K14(6.5,-2.5) L1(-6.5,-3.5) L2(-5.5,-3.5) L3(-4.5,-3.5) L4(-3.5,-3.5) L5(-2.5,-3.5) L6(-1.5,-3.5) L7(-0.5,-3.5) L8(0.5,-3.5) L9(1.5,-3.5) L10(2.5,-3.5) L11(3.5,-3.5) L12(4.5,-3.5) L13(5.5,-3.5) L14(6.5,-3.5) M1(-6.5,-4.5) M2(-5.5,-4.5) M3(-4.5,-4.5) M4(-3.5,-4.5) M5(-2.5,-4.5) M6(-1.5,-4.5) M7(-0.5,-4.5) M8(0.5,-4.5) M9(1.5,-4.5) M10(2.5,-4.5) M11(3.5,-4.5) M12(4.5,-4.5) M13(5.5,-4.5) M14(6.5,-4.5) N1(-6.5,-5.5) N2(-5.5,-5.5) N3(-4.5,-5.5) N4(-3.5,-5.5) N5(-2.5,-5.5) N6(-1.5,-5.5) N7(-0.5,-5.5) N8(0.5,-5.5) N9(1.5,-5.5) N10(2.5,-5.5) N11(3.5,-5.5) N12(4.5,-5.5) N13(5.5,-5.5) N14(6.5,-5.5) P1(-6.5,-6.5) P2(-5.5,-6.5) P3(-4.5,-6.5) P4(-3.5,-6.5) P5(-2.5,-6.5) P6(-1.5,-6.5) P7(-0.5,-6.5) P8(0.5,-6.5) P9(1.5,-6.5) P10(2.5,-6.5) P11(3.5,-6.5) P12(4.5,-6.5) P13(5.5,-6.5) P14(6.5,-6.5)
  round 1 smd paste-0.51 mask+0.5: FTG1(-8.35,-8.35) FTG2(8.35,8.35)
Top Layer keep-out:
  circle w0.1: c8.35,8.35 r1
  circle w0.1: c-8.35,-8.35 r1
Top Overlay:
  circle w0.25: c-8.1,6.5 r0.125
  lines w0.2: -7.5,6.5 -6.5,7.5 ; -7.5,6.7 -6.7,7.5 ; -7.5,6.9 -6.9,7.5 ; -7.5,7.1 -7.1,7.5 ; -7.5,7.3 -7.3,7.5 ; -7.5,-7.5 7.5,-7.5 7.5,7.5 -7.5,7.5 -7.5,-7.5
Mechanical 14:
  lines w0.1: -7.5,6.5 -6.5,7.5 ; -7.5,6.6 -6.6,7.5 ; -7.5,6.7 -6.7,7.5 ; -7.5,6.8 -6.8,7.5 ; -7.5,6.9 -6.9,7.5 ; -7.5,7 -7,7.5 ; -7.5,7.1 -7.1,7.5 ; -7.5,7.2 -7.2,7.5 ; -7.5,7.3 -7.3,7.5 ; -7.5,7.4 -7.4,7.5 ; -7.5,-7.5 7.5,-7.5 7.5,7.5 -7.5,7.5 -7.5,-7.5
  text "P" at -8.4,-6.8 h0.6
  text "N" at -8.4,-5.8 h0.6
  text "M" at -8.4,-4.8 h0.6
  text "L" at -8.4,-3.8 h0.6
  text "K" at -8.4,-2.8 h0.6
  text "J" at -8.4,-1.8 h0.6
  text "H" at -8.4,-0.8 h0.6
  text "G" at -8.4,0.2 h0.6
  text "F" at -8.4,1.2 h0.6
  text "E" at -8.4,2.2 h0.6
  text "D" at -8.4,3.2 h0.6
  text "C" at -8.4,4.2 h0.6
  text "B" at -8.4,5.2 h0.6
  text "A" at -8.4,6.2 h0.6
  text "2" at -5.125,8 h0.6
  text "3" at -4.125,8 h0.6
  text "4" at -3.125,8 h0.6
  text "5" at -2.125,8 h0.6
  text "14" at 6.65,8 h0.6
  text "13" at 5.675,8 h0.6
  text "12" at 4.7,8 h0.6
  text "11" at 3.775,8 h0.6
  text "10" at 2.725,8 h0.6
  text "9" at 1.925,8 h0.6
  text "8" at 0.85,8 h0.6
  text "7" at -0.125,8 h0.6
  text "6" at -1.125,8 h0.6
  text "1" at -6.075,8 h0.6
Mechanical 15:
  circle w0.05: c0,0 r0.35
  lines w0.05: -0.5,0 0.5,0 ; 0,-0.5 0,0.5 ; -8.5,-8.5 8.5,-8.5 8.5,8.5 -8.5,8.5 -8.5,-8.5
3D body "BGA196C100P14X14_1500X1500X181.stp": height 1.81, standoff 0, extent -7.6,-7.6 7.6,7.6